# Altium footprint library Duong_update.PcbLib: 18 footprints (part 2 of 2)
Each footprint in its own frame and in the unit in brackets; x right, y up, seen from the top. Pads: shape width x height; smd on the part's side, far side on the other; paste and mask are expansions set on the pad; w line width, h text height; cw(c..) or ccw(c..) is an arc to the next point about the centre after c.
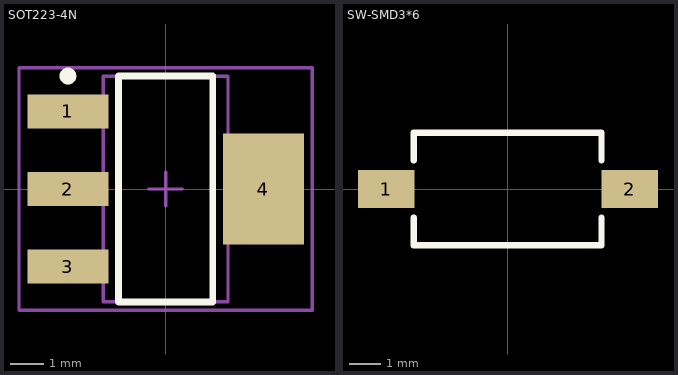
[diagram p1: the footprints below, top view; thin cyan lines are the x and y axes]

## SOT223-4N [mm] "SOT223, 4-Leads, Body 6.5x3.5mm, Pitch 2.3mm, Lead Span 7mm, IPC Medium Density"
height 1.8
pads (4):
  rect 2.4x1 smd: 1(-2.9,2.3) 2(-2.9,0) 3(-2.9,-2.3)
  rect 2.4x3.3 smd: 4(2.9,0)
Top Overlay:
  circle w0.25: c-2.9,3.35 r0.125
  lines w0.2: -1.4,-3.35 -1.4,3.35 1.4,3.35 1.4,-3.35 -1.4,-3.35
Mechanical 13:
  lines w0.1: -1.85,-3.35 -1.85,3.35 1.85,3.35 1.85,-3.35 -1.85,-3.35
Mechanical 15:
  lines w0.1: -0.5,0 0.5,0 ; 0,-0.5 0,0.5 ; -4.35,-3.6 -4.35,3.6 4.35,3.6 4.35,-3.6 -4.35,-3.6
3D body: height 1.8, standoff 0, extent -1.85,-3.35 1.85,3.35

## SW-SMD3*6 [mm] "SW-SMD3*6*2.5"
pads (2):
  rect 1.8x1.2 smd: 1(-3.881,0) 2(3.906,0)
Top Overlay:
  lines w0.2: -3,-1.8 3,-1.8 ; -3,1.8 3,1.8 ; -2.997,-1.803 -2.997,-0.914 ; -2.997,0.914 -2.997,1.803 ; 2.997,-1.803 2.997,-0.914 ; 2.997,0.914 2.997,1.803
3D body "User Library-Button-SMD.step": height 2.5, standoff 0, extent -3.093,-1.886 3.007,1.814